# Altium footprint library LPC1788.PCBLIB: 33 footprints (part 1 of 3)
Each footprint in its own frame and in the unit in brackets; x right, y up, seen from the top. Pads: shape width x height; smd on the part's side, far side on the other; paste and mask are expansions set on the pad; w line width, h text height; cw(c..) or ccw(c..) is an arc to the next point about the centre after c.
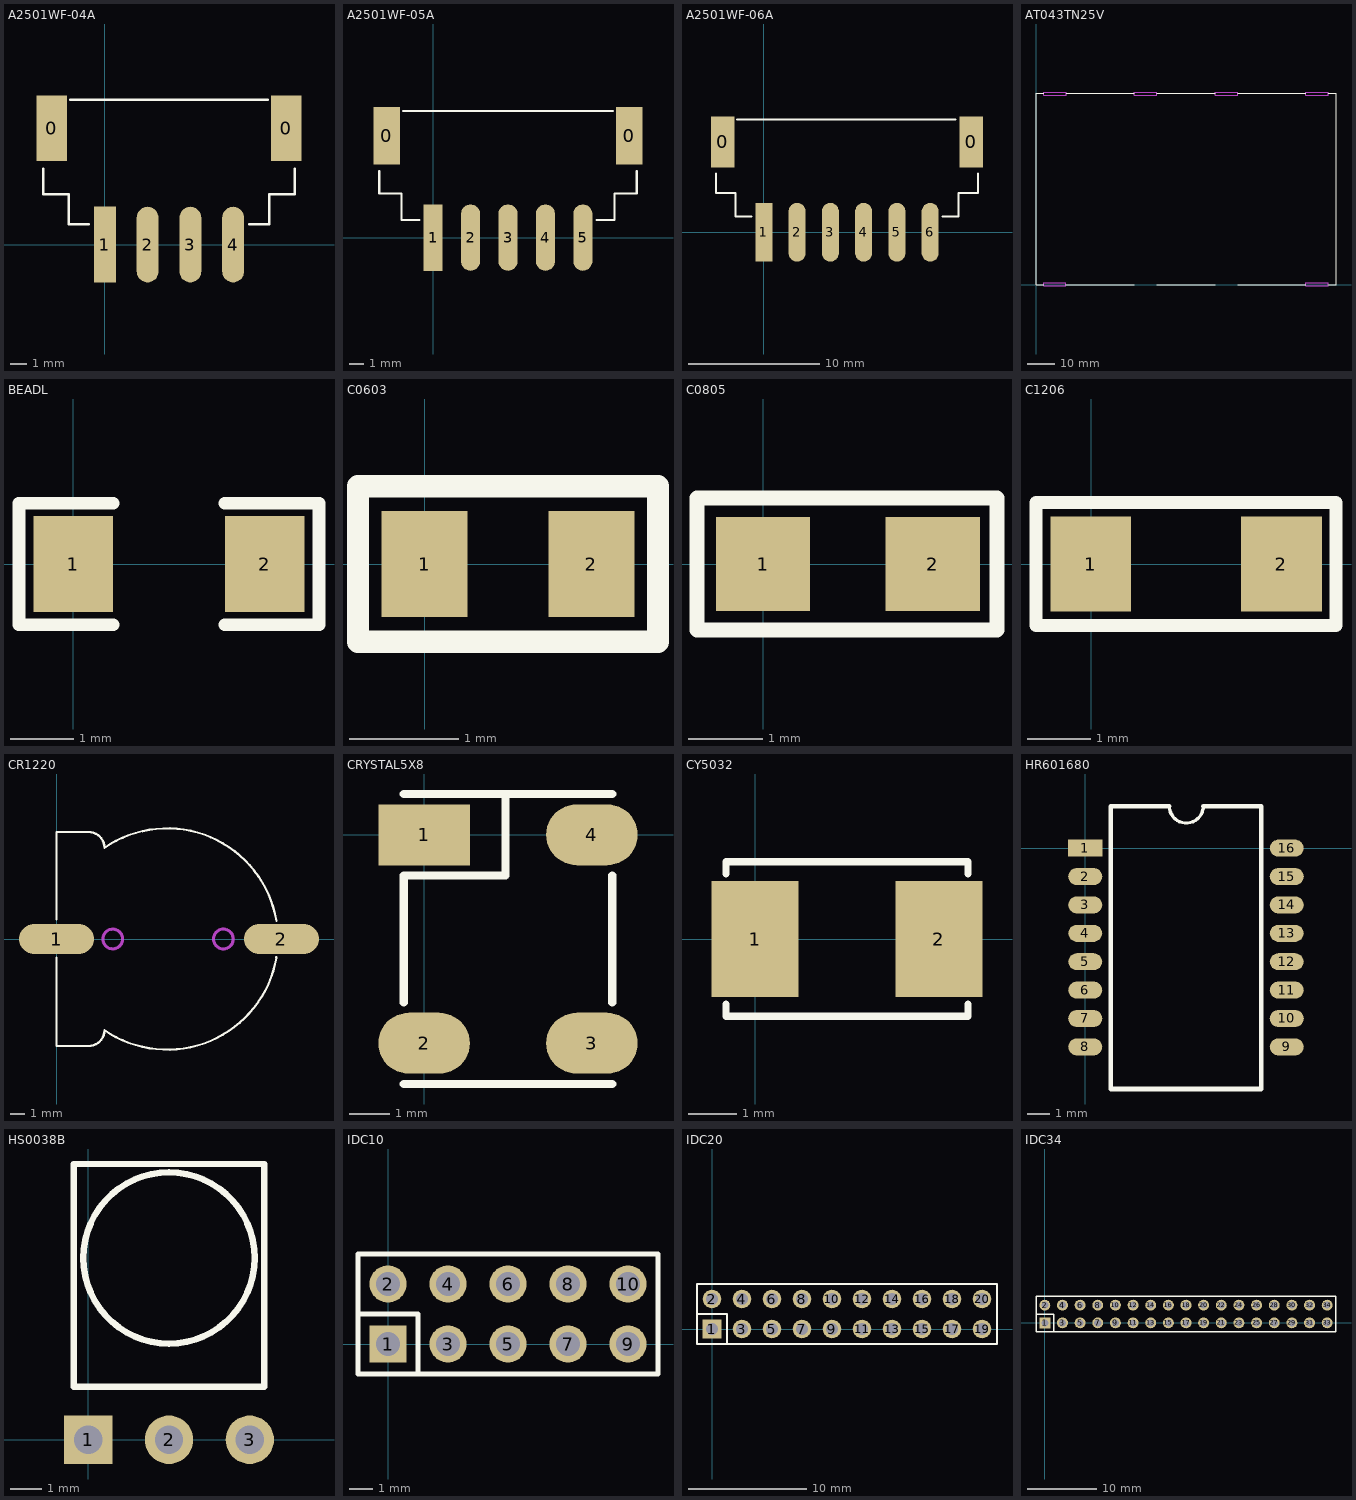
[diagram p0: the footprints below, top view; thin cyan lines are the x and y axes]

## A2501WF-04A [mm]
pads (6):
  rect 1.8x3.9 smd: 0(-3.15,6.9) 0(10.77,6.9)
  rect 1.3x4.5 smd: 1(0,0)
  oval 1.3x4.5 smd: 2(2.54,0) 3(5.08,0) 4(7.62,0)
TopOverlay:
  lines w0.152: -3.65,4.5 -3.65,3 -2.15,3 -2.15,1.2 -0.95,1.2 ; -2.05,8.6 9.67,8.6 ; 8.57,1.2 9.77,1.2 9.77,3 11.27,3 11.27,4.5
3D body: height 6, standoff 0, extent -3.694,-1.619 11.306,8.581

## A2501WF-05A [mm]
pads (7):
  rect 1.8x3.9 smd: 0(-3.15,6.9) 0(13.31,6.9)
  rect 1.3x4.5 smd: 1(0,0)
  oval 1.3x4.5 smd: 2(2.54,0) 3(5.08,0) 4(7.62,0) 5(10.16,0)
TopOverlay:
  lines w0.152: -3.65,4.5 -3.65,3 -2.15,3 -2.15,1.2 -0.95,1.2 ; -2.05,8.6 12.21,8.6 ; 11.11,1.2 12.31,1.2 12.31,3 13.81,3 13.81,4.5
3D body: height 6, standoff 0, extent -3.653,-1.64 13.847,8.71

## A2501WF-06A [mm]
pads (8):
  rect 1.8x3.9 smd: 0(-3.15,6.9) 0(15.85,6.9)
  rect 1.3x4.5 smd: 1(0,0)
  oval 1.3x4.5 smd: 2(2.54,0) 3(5.08,0) 4(7.62,0) 5(10.16,0) 6(12.7,0)
TopOverlay:
  lines w0.152: -3.65,4.5 -3.65,3 -2.15,3 -2.15,1.2 -0.95,1.2 ; -2.05,8.6 14.65,8.6 ; 13.65,1.2 14.85,1.2 14.85,3 16.35,3 16.35,4.5
3D body: height 6, standoff 0, extent -3.677,-1.769 16.323,8.581

## AT043TN25V [mil]
TopOverlay:
  lines w10: 108.27,0 0,0 0,2696.85 108.27,2696.85 ; 423.23,0 1387.8,0 ; 423.23,2696.85 1387.8,2696.85 ; 1702.76,0 2529.53,0 ; 1702.76,2696.85 2529.53,2696.85 ; 2844.49,0 3809.05,0 ; 2844.49,2696.85 3809.06,2696.85 ; 4124.02,0 4232.28,0 4232.28,2696.85 4124.02,2696.85
KeepOutLayer:
  lines w10: 108.27,-14.76 108.27,24.61 423.23,24.61 423.23,-14.76 108.27,-14.76 ; 108.27,2672.24 108.27,2711.61 423.23,2711.61 423.23,2672.24 108.27,2672.24 ; 1387.8,2673.23 1387.8,2712.6 1702.76,2712.6 1702.76,2673.23 1387.8,2673.23 ; 2529.53,2673.23 2529.53,2712.6 2844.49,2712.6 2844.49,2673.23 2529.53,2673.23 ; 3809.05,-13.78 3809.05,25.59 4124.02,25.59 4124.02,-13.78 3809.05,-13.78 ; 3809.06,2673.23 3809.06,2712.6 4124.02,2712.6 4124.02,2673.23 3809.06,2673.23
Mechanical1:
  lines w10: 108.27,-14.76 108.27,24.61 423.23,24.61 423.23,-14.76 108.27,-14.76 ; 108.27,2672.24 108.27,2711.61 423.23,2711.61 423.23,2672.24 108.27,2672.24 ; 1387.8,2673.23 1387.8,2712.6 1702.76,2712.6 1702.76,2673.23 1387.8,2673.23 ; 2529.53,2673.23 2529.53,2712.6 2844.49,2712.6 2844.49,2673.23 2529.53,2673.23 ; 3809.05,-13.78 4124.02,-13.78 4124.02,25.59 3809.05,25.59 3809.05,-13.78 ; 3809.06,2673.23 3809.06,2712.6 4124.02,2712.6 4124.02,2673.23 3809.06,2673.23

## BEADL [mil]
pads (2):
  rect 50x60 smd: 1(0,0) 2(120,0)
TopOverlay:
  lines w8: 25,-38 -34,-38 -34,38 25,38 ; 95,-38 154,-38 154,38 95,38
3D body: height 39.37, standoff 0, extent -6.93,-35.43 126.93,35.44

## C0603 [mil]
pads (2):
  rect 31x38 smd: 1(0,0) 2(60,0)
TopOverlay:
  lines w8: -24,-28 84,-28 84,28 -24,28 -24,-28
3D body: height 35.43, standoff 0, extent -3.46,-17.71 63.47,17.72

## C0805 [mil]
pads (2):
  rect 50x50 smd: 1(0,0) 2(90,0)
TopOverlay:
  lines w8: -35,-35 -35,35 124,35 124,-35 -35,-35
3D body: height 53.15, standoff 0, extent 1.7,-28.54 88.31,28.55

## C1206 [mm]
pads (2):
  rect 1.27x1.5 smd: 1(-0.004,0.005) 2(2.996,0.005)
TopOverlay:
  lines w0.203: -0.868,-0.96 3.854,-0.96 3.854,0.97 -0.868,0.97 -0.868,-0.96
3D body: height 1, standoff 0, extent -0.176,-0.9 3.224,0.9

## CR1220 [mil]
pads (2):
  oval 200x80 smd: 1(0,0) 2(600,0)
TopOverlay:
  lines w6: 0,-50.2 0,-285.43 85.63,-285.43 ccw(c85.63,-243.11) 127.95,-243.11 ccw(c295.28,0) 586.31,-48.99 ; 0,52.16 0,285.43 85.63,285.43 cw(c85.63,243.11) 127.95,243.11 cw(c295.28,0) 586.41,48.36
KeepOutLayer:
  circle w8: c445,0 r26.63
  circle w8: c150,0 r26.63
Mechanical1:
  circle w8: c445,0 r26.25
  circle w8: c150,0 r26.17
3D body: height 157.58, standoff -31.4, extent -57.94,-294.64 657.38,295.82

## CRYSTAL5X8 [mil]
pads (4):
  rect 90x60 smd: 1(-0.17,0.2)
  oval 90x60 smd: 2(-0.17,-204.8) 3(164.83,-204.8) 4(164.83,0.2)
TopOverlay:
  lines w8: -20.17,-244.8 184.83,-244.8 ; -20.17,-164.8 -20.17,-39.8 79.83,-39.8 79.83,40.2 ; -20.17,40.2 184.83,40.2 ; 184.83,-164.8 184.83,-39.8
3D body: height 55.91, standoff 0, extent -16,-240 180.85,35.59

## CY5032 [mm]
pads (2):
  rect 1.8x2.4 smd: 1(0,0) 2(3.8,0)
TopOverlay:
  lines w0.152: -0.6,-1.35 -0.6,-1.6 4.4,-1.6 4.4,-1.35 ; -0.6,1.35 -0.6,1.6 4.4,1.6 4.4,1.35
3D body: height 1.21, standoff 0, extent -0.6,-1.6 4.4,1.6

## HR601680 [mil]
pads (16):
  rect 60x30 smd: 1(0,0)
  oval 60x30 smd: 2(0,-50) 3(0,-100) 4(0,-150) 5(0,-200) 6(0,-250) 7(0,-300) 8(0,-350) 9(355,-350) 10(355,-300) 11(355,-250) 12(355,-200) 13(355,-150) 14(355,-100) 15(355,-50) 16(355,0)
TopOverlay:
  lines w6: 148,74.18 ccw(c178,74.18) 208,74.18
  lines w8: 148,74.18 45,74.18 45,-424.18 310,-424.18 310,74.18 208,74.18
3D body: height 225.2, standoff 0, extent -7.54,-419.09 362.54,69.1

## HS0038B [mil]
pads (3):
  rect 60x60 hole 35: 1(-0.17,0.2)
  round 60 hole 35: 2(99.83,0.2) 3(199.83,0.2)
TopOverlay:
  circle w8: c99.83,225.2 r106.07
  lines w8: -18.28,65.95 217.94,65.95 217.94,341.54 -18.28,341.54 -18.28,65.95
3D body: height 191.87, standoff -78.74, extent -19,-7.24 217.22,337.24

## IDC10 [mil]
pads (10):
  rect 62x62 hole 40: 1(-0.35,0.41)
  round 62 hole 40: 2(-0.35,100.41) 3(99.65,0.41) 4(99.65,100.41) 5(199.65,0.41) 6(199.65,100.41) 7(299.65,0.41) 8(299.65,100.41) 9(399.65,0.41) 10(399.65,100.41)
TopOverlay:
  lines w8: -50.35,50.41 49.65,50.41 49.65,-49.59 ; -50.35,-49.59 -50.35,150.41 449.65,150.41 449.65,-49.59 -50.35,-49.59
3D body: height 314.96, standoff -118.11, extent -50,-50 450,150

## IDC20 [mil]
pads (20):
  rect 62x62 hole 40: 1(-0.17,0.2)
  round 62 hole 40: 2(-0.17,100.2) 3(99.83,0.2) 4(99.83,100.2) 5(199.83,0.2) 6(199.83,100.2) 7(299.83,0.2) 8(299.83,100.2) 9(399.83,0.2) 10(399.83,100.2) 11(499.83,0.2) 12(499.83,100.2) 13(599.83,0.2) 14(599.83,100.2) 15(699.83,0.2) 16(699.83,100.2) 17(799.83,0.2) 18(799.83,100.2) 19(899.83,0.2) 20(899.83,100.2)
TopOverlay:
  lines w8: -50.17,50.2 49.83,50.2 49.83,-49.8 ; -50.17,-49.8 -50.17,150.2 949.83,150.2 949.83,-49.8 -50.17,-49.8
3D body: height 374.8, standoff -127.17, extent -200,-14.97 1099.21,541.72

## IDC34 [mil]
pads (34):
  rect 62x62 hole 40: 1(-0.17,0.2)
  round 62 hole 40: 2(-0.17,100.2) 3(99.83,0.2) 4(99.83,100.2) 5(199.83,0.2) 6(199.83,100.2) 7(299.83,0.2) 8(299.83,100.2) 9(399.83,0.2) 10(399.83,100.2) 11(499.83,0.2) 12(499.83,100.2) 13(599.83,0.2) 14(599.83,100.2) 15(699.83,0.2) 16(699.83,100.2) 17(799.83,0.2) 18(799.83,100.2) 19(899.83,0.2) 20(899.83,100.2) 21(999.83,0.2) 22(999.83,100.2) 23(1099.83,0.2) 24(1099.83,100.2) 25(1199.83,0.2) 26(1199.83,100.2) 27(1299.83,0.2) 28(1299.83,100.2) 29(1399.83,0.2) 30(1399.83,100.2) 31(1499.83,0.2) 32(1499.83,100.2) 33(1599.83,0.2) 34(1599.83,100.2)
TopOverlay:
  lines w8: -50.17,50.2 49.83,50.2 49.83,-49.8 ; -50.17,-49.8 1649.83,-49.8 1649.83,150.2 -50.17,150.2 -50.17,-49.8
3D body: height 708.66, standoff -118.11, extent -49,-49 1651,151